# Altium footprint library ST封装.PcbLib: 1336 footprints (part 80 of 109)
Each footprint in its own frame and in the unit in brackets; x right, y up, seen from the top. Pads: shape width x height; smd on the part's side, far side on the other; paste and mask are expansions set on the pad; w line width, h text height; cw(c..) or ccw(c..) is an arc to the next point about the centre after c.
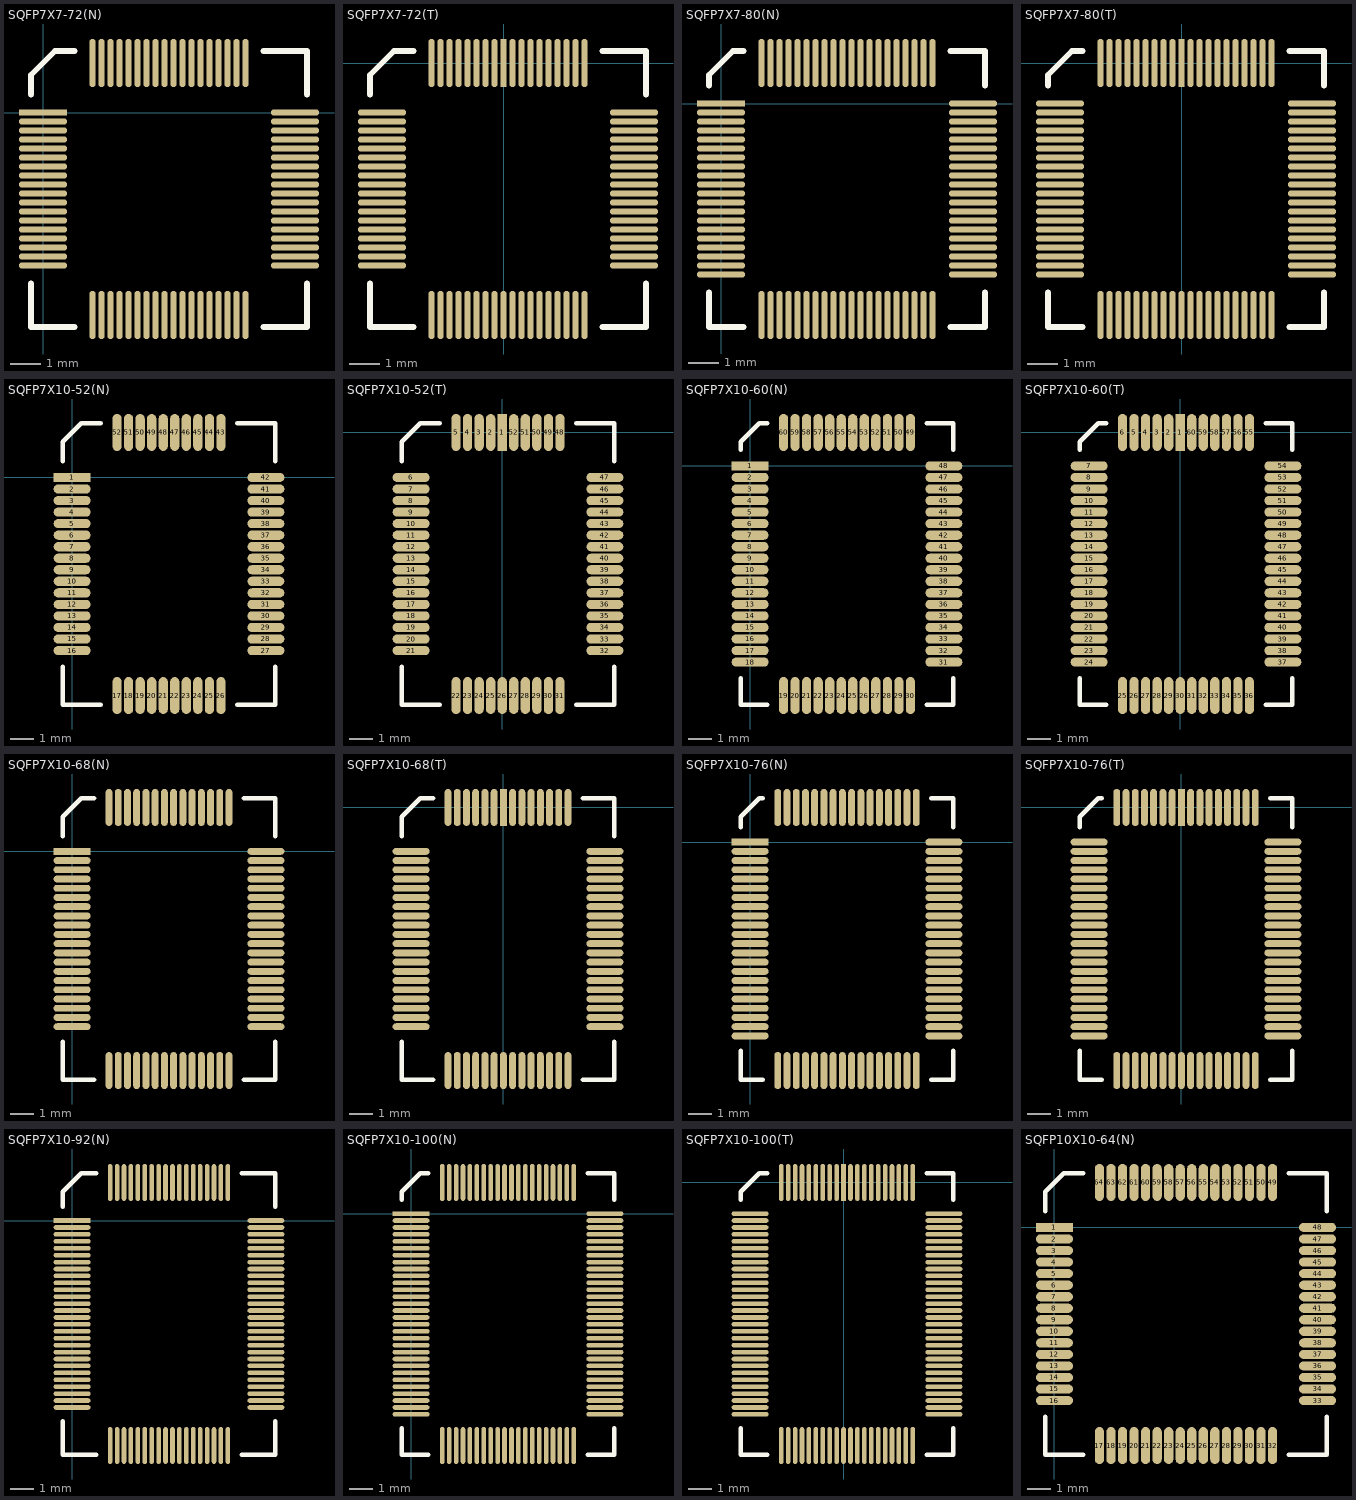
[diagram p79: the footprints below, top view; thin cyan lines are the x and y axes]

## SQFP7X7-72(N) [mm]
pads (72):
  rect 1.6x0.2 smd: 1(0,0)
  oval 1.6x0.2 smd: 2(0,-0.3) 3(0,-0.6) 4(0,-0.9) 5(0,-1.2) 6(0,-1.5) 7(0,-1.8) 8(0,-2.1) 9(0,-2.4) 10(0,-2.7) 11(0,-3) 12(0,-3.3) 13(0,-3.6) 14(0,-3.9) 15(0,-4.2) 16(0,-4.5) 17(0,-4.8) 18(0,-5.1) 37(8.4,-5.1) 38(8.4,-4.8) 39(8.4,-4.5) 40(8.4,-4.2) 41(8.4,-3.9) 42(8.4,-3.6) 43(8.4,-3.3) 44(8.4,-3) 45(8.4,-2.7) 46(8.4,-2.4) 47(8.4,-2.1) 48(8.4,-1.8) 49(8.4,-1.5) 50(8.4,-1.2) 51(8.4,-0.9) 52(8.4,-0.6) 53(8.4,-0.3) 54(8.4,0)
  oval 0.2x1.6 smd: 19(1.65,-6.75) 20(1.95,-6.75) 21(2.25,-6.75) 22(2.55,-6.75) 23(2.85,-6.75) 24(3.15,-6.75) 25(3.45,-6.75) 26(3.75,-6.75) 27(4.05,-6.75) 28(4.35,-6.75) 29(4.65,-6.75) 30(4.95,-6.75) 31(5.25,-6.75) 32(5.55,-6.75) 33(5.85,-6.75) 34(6.15,-6.75) 35(6.45,-6.75) 36(6.75,-6.75) 55(6.75,1.65) 56(6.45,1.65) 57(6.15,1.65) 58(5.85,1.65) 59(5.55,1.65) 60(5.25,1.65) 61(4.95,1.65) 62(4.65,1.65) 63(4.35,1.65) 64(4.05,1.65) 65(3.75,1.65) 66(3.45,1.65) 67(3.15,1.65) 68(2.85,1.65) 69(2.55,1.65) 70(2.25,1.65) 71(1.95,1.65) 72(1.65,1.65)
Top Overlay:
  lines w0.2: -0.4,-5.7 -0.4,-7.15 1.05,-7.15 ; -0.4,0.6 -0.4,1.25 0.4,2.05 1.05,2.05 ; 7.35,-7.15 8.8,-7.15 8.8,-5.7 ; 7.35,2.05 8.8,2.05 8.8,0.6

## SQFP7X7-72(T) [mm]
pads (72):
  rect 0.2x1.6 smd: 1(0,0)
  oval 0.2x1.6 smd: 2(-0.3,0) 3(-0.6,0) 4(-0.9,0) 5(-1.2,0) 6(-1.5,0) 7(-1.8,0) 8(-2.1,0) 9(-2.4,0) 28(-2.4,-8.4) 29(-2.1,-8.4) 30(-1.8,-8.4) 31(-1.5,-8.4) 32(-1.2,-8.4) 33(-0.9,-8.4) 34(-0.6,-8.4) 35(-0.3,-8.4) 36(0,-8.4) 37(0.3,-8.4) 38(0.6,-8.4) 39(0.9,-8.4) 40(1.2,-8.4) 41(1.5,-8.4) 42(1.8,-8.4) 43(2.1,-8.4) 44(2.4,-8.4) 45(2.7,-8.4) 64(2.7,0) 65(2.4,0) 66(2.1,0) 67(1.8,0) 68(1.5,0) 69(1.2,0) 70(0.9,0) 71(0.6,0) 72(0.3,0)
  oval 1.6x0.2 smd: 10(-4.05,-1.65) 11(-4.05,-1.95) 12(-4.05,-2.25) 13(-4.05,-2.55) 14(-4.05,-2.85) 15(-4.05,-3.15) 16(-4.05,-3.45) 17(-4.05,-3.75) 18(-4.05,-4.05) 19(-4.05,-4.35) 20(-4.05,-4.65) 21(-4.05,-4.95) 22(-4.05,-5.25) 23(-4.05,-5.55) 24(-4.05,-5.85) 25(-4.05,-6.15) 26(-4.05,-6.45) 27(-4.05,-6.75) 46(4.35,-6.75) 47(4.35,-6.45) 48(4.35,-6.15) 49(4.35,-5.85) 50(4.35,-5.55) 51(4.35,-5.25) 52(4.35,-4.95) 53(4.35,-4.65) 54(4.35,-4.35) 55(4.35,-4.05) 56(4.35,-3.75) 57(4.35,-3.45) 58(4.35,-3.15) 59(4.35,-2.85) 60(4.35,-2.55) 61(4.35,-2.25) 62(4.35,-1.95) 63(4.35,-1.65)
Top Overlay:
  lines w0.2: -4.45,-7.35 -4.45,-8.8 -3,-8.8 ; -4.45,-1.05 -4.45,-0.4 -3.65,0.4 -3,0.4 ; 3.3,-8.8 4.75,-8.8 4.75,-7.35 ; 3.3,0.4 4.75,0.4 4.75,-1.05

## SQFP7X7-80(N) [mm]
pads (80):
  rect 1.6x0.2 smd: 1(0,0)
  oval 1.6x0.2 smd: 2(0,-0.3) 3(0,-0.6) 4(0,-0.9) 5(0,-1.2) 6(0,-1.5) 7(0,-1.8) 8(0,-2.1) 9(0,-2.4) 10(0,-2.7) 11(0,-3) 12(0,-3.3) 13(0,-3.6) 14(0,-3.9) 15(0,-4.2) 16(0,-4.5) 17(0,-4.8) 18(0,-5.1) 19(0,-5.4) 20(0,-5.7) 41(8.4,-5.7) 42(8.4,-5.4) 43(8.4,-5.1) 44(8.4,-4.8) 45(8.4,-4.5) 46(8.4,-4.2) 47(8.4,-3.9) 48(8.4,-3.6) 49(8.4,-3.3) 50(8.4,-3) 51(8.4,-2.7) 52(8.4,-2.4) 53(8.4,-2.1) 54(8.4,-1.8) 55(8.4,-1.5) 56(8.4,-1.2) 57(8.4,-0.9) 58(8.4,-0.6) 59(8.4,-0.3) 60(8.4,0)
  oval 0.2x1.6 smd: 21(1.35,-7.05) 22(1.65,-7.05) 23(1.95,-7.05) 24(2.25,-7.05) 25(2.55,-7.05) 26(2.85,-7.05) 27(3.15,-7.05) 28(3.45,-7.05) 29(3.75,-7.05) 30(4.05,-7.05) 31(4.35,-7.05) 32(4.65,-7.05) 33(4.95,-7.05) 34(5.25,-7.05) 35(5.55,-7.05) 36(5.85,-7.05) 37(6.15,-7.05) 38(6.45,-7.05) 39(6.75,-7.05) 40(7.05,-7.05) 61(7.05,1.35) 62(6.75,1.35) 63(6.45,1.35) 64(6.15,1.35) 65(5.85,1.35) 66(5.55,1.35) 67(5.25,1.35) 68(4.95,1.35) 69(4.65,1.35) 70(4.35,1.35) 71(4.05,1.35) 72(3.75,1.35) 73(3.45,1.35) 74(3.15,1.35) 75(2.85,1.35) 76(2.55,1.35) 77(2.25,1.35) 78(1.95,1.35) 79(1.65,1.35) 80(1.35,1.35)
Top Overlay:
  lines w0.2: -0.4,-6.3 -0.4,-7.45 0.75,-7.45 ; -0.4,0.6 -0.4,0.95 0.4,1.75 0.75,1.75 ; 7.65,-7.45 8.8,-7.45 8.8,-6.3 ; 7.65,1.75 8.8,1.75 8.8,0.6

## SQFP7X7-80(T) [mm]
pads (80):
  rect 0.2x1.6 smd: 1(0,0)
  oval 0.2x1.6 smd: 2(-0.3,0) 3(-0.6,0) 4(-0.9,0) 5(-1.2,0) 6(-1.5,0) 7(-1.8,0) 8(-2.1,0) 9(-2.4,0) 10(-2.7,0) 31(-2.7,-8.4) 32(-2.4,-8.4) 33(-2.1,-8.4) 34(-1.8,-8.4) 35(-1.5,-8.4) 36(-1.2,-8.4) 37(-0.9,-8.4) 38(-0.6,-8.4) 39(-0.3,-8.4) 40(0,-8.4) 41(0.3,-8.4) 42(0.6,-8.4) 43(0.9,-8.4) 44(1.2,-8.4) 45(1.5,-8.4) 46(1.8,-8.4) 47(2.1,-8.4) 48(2.4,-8.4) 49(2.7,-8.4) 50(3,-8.4) 71(3,0) 72(2.7,0) 73(2.4,0) 74(2.1,0) 75(1.8,0) 76(1.5,0) 77(1.2,0) 78(0.9,0) 79(0.6,0) 80(0.3,0)
  oval 1.6x0.2 smd: 11(-4.05,-1.35) 12(-4.05,-1.65) 13(-4.05,-1.95) 14(-4.05,-2.25) 15(-4.05,-2.55) 16(-4.05,-2.85) 17(-4.05,-3.15) 18(-4.05,-3.45) 19(-4.05,-3.75) 20(-4.05,-4.05) 21(-4.05,-4.35) 22(-4.05,-4.65) 23(-4.05,-4.95) 24(-4.05,-5.25) 25(-4.05,-5.55) 26(-4.05,-5.85) 27(-4.05,-6.15) 28(-4.05,-6.45) 29(-4.05,-6.75) 30(-4.05,-7.05) 51(4.35,-7.05) 52(4.35,-6.75) 53(4.35,-6.45) 54(4.35,-6.15) 55(4.35,-5.85) 56(4.35,-5.55) 57(4.35,-5.25) 58(4.35,-4.95) 59(4.35,-4.65) 60(4.35,-4.35) 61(4.35,-4.05) 62(4.35,-3.75) 63(4.35,-3.45) 64(4.35,-3.15) 65(4.35,-2.85) 66(4.35,-2.55) 67(4.35,-2.25) 68(4.35,-1.95) 69(4.35,-1.65) 70(4.35,-1.35)
Top Overlay:
  lines w0.2: -4.45,-7.65 -4.45,-8.8 -3.3,-8.8 ; -4.45,-0.75 -4.45,-0.4 -3.65,0.4 -3.3,0.4 ; 3.6,-8.8 4.75,-8.8 4.75,-7.65 ; 3.6,0.4 4.75,0.4 4.75,-0.75

## SQFP7X10-52(N) [mm]
pads (52):
  rect 1.6x0.4 smd: 1(0,0)
  oval 1.6x0.4 smd: 2(0,-0.5) 3(0,-1) 4(0,-1.5) 5(0,-2) 6(0,-2.5) 7(0,-3) 8(0,-3.5) 9(0,-4) 10(0,-4.5) 11(0,-5) 12(0,-5.5) 13(0,-6) 14(0,-6.5) 15(0,-7) 16(0,-7.5) 27(8.4,-7.5) 28(8.4,-7) 29(8.4,-6.5) 30(8.4,-6) 31(8.4,-5.5) 32(8.4,-5) 33(8.4,-4.5) 34(8.4,-4) 35(8.4,-3.5) 36(8.4,-3) 37(8.4,-2.5) 38(8.4,-2) 39(8.4,-1.5) 40(8.4,-1) 41(8.4,-0.5) 42(8.4,0)
  oval 0.4x1.6 smd: 17(1.95,-9.45) 18(2.45,-9.45) 19(2.95,-9.45) 20(3.45,-9.45) 21(3.95,-9.45) 22(4.45,-9.45) 23(4.95,-9.45) 24(5.45,-9.45) 25(5.95,-9.45) 26(6.45,-9.45) 43(6.45,1.95) 44(5.95,1.95) 45(5.45,1.95) 46(4.95,1.95) 47(4.45,1.95) 48(3.95,1.95) 49(3.45,1.95) 50(2.95,1.95) 51(2.45,1.95) 52(1.95,1.95)
Top Overlay:
  lines w0.2: -0.4,-8.2 -0.4,-9.85 1.25,-9.85 ; -0.4,0.7 -0.4,1.55 0.4,2.35 1.25,2.35 ; 7.15,-9.85 8.8,-9.85 8.8,-8.2 ; 7.15,2.35 8.8,2.35 8.8,0.7

## SQFP7X10-52(T) [mm]
pads (52):
  rect 0.4x1.6 smd: 1(0,0)
  oval 0.4x1.6 smd: 2(-0.5,0) 3(-1,0) 4(-1.5,0) 5(-2,0) 22(-2,-11.4) 23(-1.5,-11.4) 24(-1,-11.4) 25(-0.5,-11.4) 26(0,-11.4) 27(0.5,-11.4) 28(1,-11.4) 29(1.5,-11.4) 30(2,-11.4) 31(2.5,-11.4) 48(2.5,0) 49(2,0) 50(1.5,0) 51(1,0) 52(0.5,0)
  oval 1.6x0.4 smd: 6(-3.95,-1.95) 7(-3.95,-2.45) 8(-3.95,-2.95) 9(-3.95,-3.45) 10(-3.95,-3.95) 11(-3.95,-4.45) 12(-3.95,-4.95) 13(-3.95,-5.45) 14(-3.95,-5.95) 15(-3.95,-6.45) 16(-3.95,-6.95) 17(-3.95,-7.45) 18(-3.95,-7.95) 19(-3.95,-8.45) 20(-3.95,-8.95) 21(-3.95,-9.45) 32(4.45,-9.45) 33(4.45,-8.95) 34(4.45,-8.45) 35(4.45,-7.95) 36(4.45,-7.45) 37(4.45,-6.95) 38(4.45,-6.45) 39(4.45,-5.95) 40(4.45,-5.45) 41(4.45,-4.95) 42(4.45,-4.45) 43(4.45,-3.95) 44(4.45,-3.45) 45(4.45,-2.95) 46(4.45,-2.45) 47(4.45,-1.95)
Top Overlay:
  lines w0.2: -4.35,-10.15 -4.35,-11.8 -2.7,-11.8 ; -4.35,-1.25 -4.35,-0.4 -3.55,0.4 -2.7,0.4 ; 3.2,-11.8 4.85,-11.8 4.85,-10.15 ; 3.2,0.4 4.85,0.4 4.85,-1.25

## SQFP7X10-60(N) [mm]
pads (60):
  rect 1.6x0.4 smd: 1(0,0)
  oval 1.6x0.4 smd: 2(0,-0.5) 3(0,-1) 4(0,-1.5) 5(0,-2) 6(0,-2.5) 7(0,-3) 8(0,-3.5) 9(0,-4) 10(0,-4.5) 11(0,-5) 12(0,-5.5) 13(0,-6) 14(0,-6.5) 15(0,-7) 16(0,-7.5) 17(0,-8) 18(0,-8.5) 31(8.4,-8.5) 32(8.4,-8) 33(8.4,-7.5) 34(8.4,-7) 35(8.4,-6.5) 36(8.4,-6) 37(8.4,-5.5) 38(8.4,-5) 39(8.4,-4.5) 40(8.4,-4) 41(8.4,-3.5) 42(8.4,-3) 43(8.4,-2.5) 44(8.4,-2) 45(8.4,-1.5) 46(8.4,-1) 47(8.4,-0.5) 48(8.4,0)
  oval 0.4x1.6 smd: 19(1.45,-9.95) 20(1.95,-9.95) 21(2.45,-9.95) 22(2.95,-9.95) 23(3.45,-9.95) 24(3.95,-9.95) 25(4.45,-9.95) 26(4.95,-9.95) 27(5.45,-9.95) 28(5.95,-9.95) 29(6.45,-9.95) 30(6.95,-9.95) 49(6.95,1.45) 50(6.45,1.45) 51(5.95,1.45) 52(5.45,1.45) 53(4.95,1.45) 54(4.45,1.45) 55(3.95,1.45) 56(3.45,1.45) 57(2.95,1.45) 58(2.45,1.45) 59(1.95,1.45) 60(1.45,1.45)
Top Overlay:
  lines w0.2: -0.4,-9.2 -0.4,-10.35 0.75,-10.35 ; -0.4,0.7 -0.4,1.05 0.4,1.85 0.75,1.85 ; 7.65,-10.35 8.8,-10.35 8.8,-9.2 ; 7.65,1.85 8.8,1.85 8.8,0.7

## SQFP7X10-60(T) [mm]
pads (60):
  rect 0.4x1.6 smd: 1(0,0)
  oval 0.4x1.6 smd: 2(-0.5,0) 3(-1,0) 4(-1.5,0) 5(-2,0) 6(-2.5,0) 25(-2.5,-11.4) 26(-2,-11.4) 27(-1.5,-11.4) 28(-1,-11.4) 29(-0.5,-11.4) 30(0,-11.4) 31(0.5,-11.4) 32(1,-11.4) 33(1.5,-11.4) 34(2,-11.4) 35(2.5,-11.4) 36(3,-11.4) 55(3,0) 56(2.5,0) 57(2,0) 58(1.5,0) 59(1,0) 60(0.5,0)
  oval 1.6x0.4 smd: 7(-3.95,-1.45) 8(-3.95,-1.95) 9(-3.95,-2.45) 10(-3.95,-2.95) 11(-3.95,-3.45) 12(-3.95,-3.95) 13(-3.95,-4.45) 14(-3.95,-4.95) 15(-3.95,-5.45) 16(-3.95,-5.95) 17(-3.95,-6.45) 18(-3.95,-6.95) 19(-3.95,-7.45) 20(-3.95,-7.95) 21(-3.95,-8.45) 22(-3.95,-8.95) 23(-3.95,-9.45) 24(-3.95,-9.95) 37(4.45,-9.95) 38(4.45,-9.45) 39(4.45,-8.95) 40(4.45,-8.45) 41(4.45,-7.95) 42(4.45,-7.45) 43(4.45,-6.95) 44(4.45,-6.45) 45(4.45,-5.95) 46(4.45,-5.45) 47(4.45,-4.95) 48(4.45,-4.45) 49(4.45,-3.95) 50(4.45,-3.45) 51(4.45,-2.95) 52(4.45,-2.45) 53(4.45,-1.95) 54(4.45,-1.45)
Top Overlay:
  lines w0.2: -4.35,-10.65 -4.35,-11.8 -3.2,-11.8 ; -4.35,-0.75 -4.35,-0.4 -3.55,0.4 -3.2,0.4 ; 3.7,-11.8 4.85,-11.8 4.85,-10.65 ; 3.7,0.4 4.85,0.4 4.85,-0.75

## SQFP7X10-68(N) [mm]
pads (68):
  rect 1.6x0.3 smd: 1(0,0)
  oval 1.6x0.3 smd: 2(0,-0.4) 3(0,-0.8) 4(0,-1.2) 5(0,-1.6) 6(0,-2) 7(0,-2.4) 8(0,-2.8) 9(0,-3.2) 10(0,-3.6) 11(0,-4) 12(0,-4.4) 13(0,-4.8) 14(0,-5.2) 15(0,-5.6) 16(0,-6) 17(0,-6.4) 18(0,-6.8) 19(0,-7.2) 20(0,-7.6) 35(8.4,-7.6) 36(8.4,-7.2) 37(8.4,-6.8) 38(8.4,-6.4) 39(8.4,-6) 40(8.4,-5.6) 41(8.4,-5.2) 42(8.4,-4.8) 43(8.4,-4.4) 44(8.4,-4) 45(8.4,-3.6) 46(8.4,-3.2) 47(8.4,-2.8) 48(8.4,-2.4) 49(8.4,-2) 50(8.4,-1.6) 51(8.4,-1.2) 52(8.4,-0.8) 53(8.4,-0.4) 54(8.4,0)
  oval 0.3x1.6 smd: 21(1.6,-9.5) 22(2,-9.5) 23(2.4,-9.5) 24(2.8,-9.5) 25(3.2,-9.5) 26(3.6,-9.5) 27(4,-9.5) 28(4.4,-9.5) 29(4.8,-9.5) 30(5.2,-9.5) 31(5.6,-9.5) 32(6,-9.5) 33(6.4,-9.5) 34(6.8,-9.5) 55(6.8,1.9) 56(6.4,1.9) 57(6,1.9) 58(5.6,1.9) 59(5.2,1.9) 60(4.8,1.9) 61(4.4,1.9) 62(4,1.9) 63(3.6,1.9) 64(3.2,1.9) 65(2.8,1.9) 66(2.4,1.9) 67(2,1.9) 68(1.6,1.9)
Top Overlay:
  lines w0.2: -0.4,-8.25 -0.4,-9.9 0.95,-9.9 ; -0.4,0.65 -0.4,1.5 0.4,2.3 0.95,2.3 ; 7.45,-9.9 8.8,-9.9 8.8,-8.25 ; 7.45,2.3 8.8,2.3 8.8,0.65

## SQFP7X10-68(T) [mm]
pads (68):
  rect 0.3x1.6 smd: 1(0,0)
  oval 0.3x1.6 smd: 2(-0.4,0) 3(-0.8,0) 4(-1.2,0) 5(-1.6,0) 6(-2,0) 7(-2.4,0) 28(-2.4,-11.4) 29(-2,-11.4) 30(-1.6,-11.4) 31(-1.2,-11.4) 32(-0.8,-11.4) 33(-0.4,-11.4) 34(0,-11.4) 35(0.4,-11.4) 36(0.8,-11.4) 37(1.2,-11.4) 38(1.6,-11.4) 39(2,-11.4) 40(2.4,-11.4) 41(2.8,-11.4) 62(2.8,0) 63(2.4,0) 64(2,0) 65(1.6,0) 66(1.2,0) 67(0.8,0) 68(0.4,0)
  oval 1.6x0.3 smd: 8(-4,-1.9) 9(-4,-2.3) 10(-4,-2.7) 11(-4,-3.1) 12(-4,-3.5) 13(-4,-3.9) 14(-4,-4.3) 15(-4,-4.7) 16(-4,-5.1) 17(-4,-5.5) 18(-4,-5.9) 19(-4,-6.3) 20(-4,-6.7) 21(-4,-7.1) 22(-4,-7.5) 23(-4,-7.9) 24(-4,-8.3) 25(-4,-8.7) 26(-4,-9.1) 27(-4,-9.5) 42(4.4,-9.5) 43(4.4,-9.1) 44(4.4,-8.7) 45(4.4,-8.3) 46(4.4,-7.9) 47(4.4,-7.5) 48(4.4,-7.1) 49(4.4,-6.7) 50(4.4,-6.3) 51(4.4,-5.9) 52(4.4,-5.5) 53(4.4,-5.1) 54(4.4,-4.7) 55(4.4,-4.3) 56(4.4,-3.9) 57(4.4,-3.5) 58(4.4,-3.1) 59(4.4,-2.7) 60(4.4,-2.3) 61(4.4,-1.9)
Top Overlay:
  lines w0.2: -4.4,-10.15 -4.4,-11.8 -3.05,-11.8 ; -4.4,-1.25 -4.4,-0.4 -3.6,0.4 -3.05,0.4 ; 3.45,-11.8 4.8,-11.8 4.8,-10.15 ; 3.45,0.4 4.8,0.4 4.8,-1.25

## SQFP7X10-76(N) [mm]
pads (76):
  rect 1.6x0.3 smd: 1(0,0)
  oval 1.6x0.3 smd: 2(0,-0.4) 3(0,-0.8) 4(0,-1.2) 5(0,-1.6) 6(0,-2) 7(0,-2.4) 8(0,-2.8) 9(0,-3.2) 10(0,-3.6) 11(0,-4) 12(0,-4.4) 13(0,-4.8) 14(0,-5.2) 15(0,-5.6) 16(0,-6) 17(0,-6.4) 18(0,-6.8) 19(0,-7.2) 20(0,-7.6) 21(0,-8) 22(0,-8.4) 39(8.4,-8.4) 40(8.4,-8) 41(8.4,-7.6) 42(8.4,-7.2) 43(8.4,-6.8) 44(8.4,-6.4) 45(8.4,-6) 46(8.4,-5.6) 47(8.4,-5.2) 48(8.4,-4.8) 49(8.4,-4.4) 50(8.4,-4) 51(8.4,-3.6) 52(8.4,-3.2) 53(8.4,-2.8) 54(8.4,-2.4) 55(8.4,-2) 56(8.4,-1.6) 57(8.4,-1.2) 58(8.4,-0.8) 59(8.4,-0.4) 60(8.4,0)
  oval 0.3x1.6 smd: 23(1.2,-9.9) 24(1.6,-9.9) 25(2,-9.9) 26(2.4,-9.9) 27(2.8,-9.9) 28(3.2,-9.9) 29(3.6,-9.9) 30(4,-9.9) 31(4.4,-9.9) 32(4.8,-9.9) 33(5.2,-9.9) 34(5.6,-9.9) 35(6,-9.9) 36(6.4,-9.9) 37(6.8,-9.9) 38(7.2,-9.9) 61(7.2,1.5) 62(6.8,1.5) 63(6.4,1.5) 64(6,1.5) 65(5.6,1.5) 66(5.2,1.5) 67(4.8,1.5) 68(4.4,1.5) 69(4,1.5) 70(3.6,1.5) 71(3.2,1.5) 72(2.8,1.5) 73(2.4,1.5) 74(2,1.5) 75(1.6,1.5) 76(1.2,1.5)
Top Overlay:
  lines w0.2: -0.4,-9.05 -0.4,-10.3 0.55,-10.3 ; -0.4,0.65 -0.4,1.1 0.4,1.9 0.55,1.9 ; 7.85,-10.3 8.8,-10.3 8.8,-9.05 ; 7.85,1.9 8.8,1.9 8.8,0.65

## SQFP7X10-76(T) [mm]
pads (76):
  rect 0.3x1.6 smd: 1(0,0)
  oval 0.3x1.6 smd: 2(-0.4,0) 3(-0.8,0) 4(-1.2,0) 5(-1.6,0) 6(-2,0) 7(-2.4,0) 8(-2.8,0) 31(-2.8,-11.4) 32(-2.4,-11.4) 33(-2,-11.4) 34(-1.6,-11.4) 35(-1.2,-11.4) 36(-0.8,-11.4) 37(-0.4,-11.4) 38(0,-11.4) 39(0.4,-11.4) 40(0.8,-11.4) 41(1.2,-11.4) 42(1.6,-11.4) 43(2,-11.4) 44(2.4,-11.4) 45(2.8,-11.4) 46(3.2,-11.4) 69(3.2,0) 70(2.8,0) 71(2.4,0) 72(2,0) 73(1.6,0) 74(1.2,0) 75(0.8,0) 76(0.4,0)
  oval 1.6x0.3 smd: 9(-4,-1.5) 10(-4,-1.9) 11(-4,-2.3) 12(-4,-2.7) 13(-4,-3.1) 14(-4,-3.5) 15(-4,-3.9) 16(-4,-4.3) 17(-4,-4.7) 18(-4,-5.1) 19(-4,-5.5) 20(-4,-5.9) 21(-4,-6.3) 22(-4,-6.7) 23(-4,-7.1) 24(-4,-7.5) 25(-4,-7.9) 26(-4,-8.3) 27(-4,-8.7) 28(-4,-9.1) 29(-4,-9.5) 30(-4,-9.9) 47(4.4,-9.9) 48(4.4,-9.5) 49(4.4,-9.1) 50(4.4,-8.7) 51(4.4,-8.3) 52(4.4,-7.9) 53(4.4,-7.5) 54(4.4,-7.1) 55(4.4,-6.7) 56(4.4,-6.3) 57(4.4,-5.9) 58(4.4,-5.5) 59(4.4,-5.1) 60(4.4,-4.7) 61(4.4,-4.3) 62(4.4,-3.9) 63(4.4,-3.5) 64(4.4,-3.1) 65(4.4,-2.7) 66(4.4,-2.3) 67(4.4,-1.9) 68(4.4,-1.5)
Top Overlay:
  lines w0.2: -4.4,-10.55 -4.4,-11.8 -3.45,-11.8 ; -4.4,-0.85 -4.4,-0.4 -3.6,0.4 -3.45,0.4 ; 3.85,-11.8 4.8,-11.8 4.8,-10.55 ; 3.85,0.4 4.8,0.4 4.8,-0.85

## SQFP7X10-92(N) [mm]
pads (92):
  rect 1.6x0.2 smd: 1(0,0)
  oval 1.6x0.2 smd: 2(0,-0.3) 3(0,-0.6) 4(0,-0.9) 5(0,-1.2) 6(0,-1.5) 7(0,-1.8) 8(0,-2.1) 9(0,-2.4) 10(0,-2.7) 11(0,-3) 12(0,-3.3) 13(0,-3.6) 14(0,-3.9) 15(0,-4.2) 16(0,-4.5) 17(0,-4.8) 18(0,-5.1) 19(0,-5.4) 20(0,-5.7) 21(0,-6) 22(0,-6.3) 23(0,-6.6) 24(0,-6.9) 25(0,-7.2) 26(0,-7.5) 27(0,-7.8) 28(0,-8.1) 47(8.4,-8.1) 48(8.4,-7.8) 49(8.4,-7.5) 50(8.4,-7.2) 51(8.4,-6.9) 52(8.4,-6.6) 53(8.4,-6.3) 54(8.4,-6) 55(8.4,-5.7) 56(8.4,-5.4) 57(8.4,-5.1) 58(8.4,-4.8) 59(8.4,-4.5) 60(8.4,-4.2) 61(8.4,-3.9) 62(8.4,-3.6) 63(8.4,-3.3) 64(8.4,-3) 65(8.4,-2.7) 66(8.4,-2.4) 67(8.4,-2.1) 68(8.4,-1.8) 69(8.4,-1.5) 70(8.4,-1.2) 71(8.4,-0.9) 72(8.4,-0.6) 73(8.4,-0.3) 74(8.4,0)
  oval 0.2x1.6 smd: 29(1.65,-9.75) 30(1.95,-9.75) 31(2.25,-9.75) 32(2.55,-9.75) 33(2.85,-9.75) 34(3.15,-9.75) 35(3.45,-9.75) 36(3.75,-9.75) 37(4.05,-9.75) 38(4.35,-9.75) 39(4.65,-9.75) 40(4.95,-9.75) 41(5.25,-9.75) 42(5.55,-9.75) 43(5.85,-9.75) 44(6.15,-9.75) 45(6.45,-9.75) 46(6.75,-9.75) 75(6.75,1.65) 76(6.45,1.65) 77(6.15,1.65) 78(5.85,1.65) 79(5.55,1.65) 80(5.25,1.65) 81(4.95,1.65) 82(4.65,1.65) 83(4.35,1.65) 84(4.05,1.65) 85(3.75,1.65) 86(3.45,1.65) 87(3.15,1.65) 88(2.85,1.65) 89(2.55,1.65) 90(2.25,1.65) 91(1.95,1.65) 92(1.65,1.65)
Top Overlay:
  lines w0.2: -0.4,-8.7 -0.4,-10.15 1.05,-10.15 ; -0.4,0.6 -0.4,1.25 0.4,2.05 1.05,2.05 ; 7.35,-10.15 8.8,-10.15 8.8,-8.7 ; 7.35,2.05 8.8,2.05 8.8,0.6

## SQFP7X10-100(N) [mm]
pads (100):
  rect 1.6x0.2 smd: 1(0,0)
  oval 1.6x0.2 smd: 2(0,-0.3) 3(0,-0.6) 4(0,-0.9) 5(0,-1.2) 6(0,-1.5) 7(0,-1.8) 8(0,-2.1) 9(0,-2.4) 10(0,-2.7) 11(0,-3) 12(0,-3.3) 13(0,-3.6) 14(0,-3.9) 15(0,-4.2) 16(0,-4.5) 17(0,-4.8) 18(0,-5.1) 19(0,-5.4) 20(0,-5.7) 21(0,-6) 22(0,-6.3) 23(0,-6.6) 24(0,-6.9) 25(0,-7.2) 26(0,-7.5) 27(0,-7.8) 28(0,-8.1) 29(0,-8.4) 30(0,-8.7) 51(8.4,-8.7) 52(8.4,-8.4) 53(8.4,-8.1) 54(8.4,-7.8) 55(8.4,-7.5) 56(8.4,-7.2) 57(8.4,-6.9) 58(8.4,-6.6) 59(8.4,-6.3) 60(8.4,-6) 61(8.4,-5.7) 62(8.4,-5.4) 63(8.4,-5.1) 64(8.4,-4.8) 65(8.4,-4.5) 66(8.4,-4.2) 67(8.4,-3.9) 68(8.4,-3.6) 69(8.4,-3.3) 70(8.4,-3) 71(8.4,-2.7) 72(8.4,-2.4) 73(8.4,-2.1) 74(8.4,-1.8) 75(8.4,-1.5) 76(8.4,-1.2) 77(8.4,-0.9) 78(8.4,-0.6) 79(8.4,-0.3) 80(8.4,0)
  oval 0.2x1.6 smd: 31(1.35,-10.05) 32(1.65,-10.05) 33(1.95,-10.05) 34(2.25,-10.05) 35(2.55,-10.05) 36(2.85,-10.05) 37(3.15,-10.05) 38(3.45,-10.05) 39(3.75,-10.05) 40(4.05,-10.05) 41(4.35,-10.05) 42(4.65,-10.05) 43(4.95,-10.05) 44(5.25,-10.05) 45(5.55,-10.05) 46(5.85,-10.05) 47(6.15,-10.05) 48(6.45,-10.05) 49(6.75,-10.05) 50(7.05,-10.05) 81(7.05,1.35) 82(6.75,1.35) 83(6.45,1.35) 84(6.15,1.35) 85(5.85,1.35) 86(5.55,1.35) 87(5.25,1.35) 88(4.95,1.35) 89(4.65,1.35) 90(4.35,1.35) 91(4.05,1.35) 92(3.75,1.35) 93(3.45,1.35) 94(3.15,1.35) 95(2.85,1.35) 96(2.55,1.35) 97(2.25,1.35) 98(1.95,1.35) 99(1.65,1.35) 100(1.35,1.35)
Top Overlay:
  lines w0.2: -0.4,-9.3 -0.4,-10.45 0.75,-10.45 ; -0.4,0.6 -0.4,0.95 0.4,1.75 0.75,1.75 ; 7.65,-10.45 8.8,-10.45 8.8,-9.3 ; 7.65,1.75 8.8,1.75 8.8,0.6

## SQFP7X10-100(T) [mm]
pads (100):
  rect 0.2x1.6 smd: 1(0,0)
  oval 0.2x1.6 smd: 2(-0.3,0) 3(-0.6,0) 4(-0.9,0) 5(-1.2,0) 6(-1.5,0) 7(-1.8,0) 8(-2.1,0) 9(-2.4,0) 10(-2.7,0) 41(-2.7,-11.4) 42(-2.4,-11.4) 43(-2.1,-11.4) 44(-1.8,-11.4) 45(-1.5,-11.4) 46(-1.2,-11.4) 47(-0.9,-11.4) 48(-0.6,-11.4) 49(-0.3,-11.4) 50(0,-11.4) 51(0.3,-11.4) 52(0.6,-11.4) 53(0.9,-11.4) 54(1.2,-11.4) 55(1.5,-11.4) 56(1.8,-11.4) 57(2.1,-11.4) 58(2.4,-11.4) 59(2.7,-11.4) 60(3,-11.4) 91(3,0) 92(2.7,0) 93(2.4,0) 94(2.1,0) 95(1.8,0) 96(1.5,0) 97(1.2,0) 98(0.9,0) 99(0.6,0) 100(0.3,0)
  oval 1.6x0.2 smd: 11(-4.05,-1.35) 12(-4.05,-1.65) 13(-4.05,-1.95) 14(-4.05,-2.25) 15(-4.05,-2.55) 16(-4.05,-2.85) 17(-4.05,-3.15) 18(-4.05,-3.45) 19(-4.05,-3.75) 20(-4.05,-4.05) 21(-4.05,-4.35) 22(-4.05,-4.65) 23(-4.05,-4.95) 24(-4.05,-5.25) 25(-4.05,-5.55) 26(-4.05,-5.85) 27(-4.05,-6.15) 28(-4.05,-6.45) 29(-4.05,-6.75) 30(-4.05,-7.05) 31(-4.05,-7.35) 32(-4.05,-7.65) 33(-4.05,-7.95) 34(-4.05,-8.25) 35(-4.05,-8.55) 36(-4.05,-8.85) 37(-4.05,-9.15) 38(-4.05,-9.45) 39(-4.05,-9.75) 40(-4.05,-10.05) 61(4.35,-10.05) 62(4.35,-9.75) 63(4.35,-9.45) 64(4.35,-9.15) 65(4.35,-8.85) 66(4.35,-8.55) 67(4.35,-8.25) 68(4.35,-7.95) 69(4.35,-7.65) 70(4.35,-7.35) 71(4.35,-7.05) 72(4.35,-6.75) 73(4.35,-6.45) 74(4.35,-6.15) 75(4.35,-5.85) 76(4.35,-5.55) 77(4.35,-5.25) 78(4.35,-4.95) 79(4.35,-4.65) 80(4.35,-4.35) 81(4.35,-4.05) 82(4.35,-3.75) 83(4.35,-3.45) 84(4.35,-3.15) 85(4.35,-2.85) 86(4.35,-2.55) 87(4.35,-2.25) 88(4.35,-1.95) 89(4.35,-1.65) 90(4.35,-1.35)
Top Overlay:
  lines w0.2: -4.45,-10.65 -4.45,-11.8 -3.3,-11.8 ; -4.45,-0.75 -4.45,-0.4 -3.65,0.4 -3.3,0.4 ; 3.6,-11.8 4.75,-11.8 4.75,-10.65 ; 3.6,0.4 4.75,0.4 4.75,-0.75

## SQFP10X10-64(N) [mm]
pads (64):
  rect 1.6x0.4 smd: 1(0,0)
  oval 1.6x0.4 smd: 2(0,-0.5) 3(0,-1) 4(0,-1.5) 5(0,-2) 6(0,-2.5) 7(0,-3) 8(0,-3.5) 9(0,-4) 10(0,-4.5) 11(0,-5) 12(0,-5.5) 13(0,-6) 14(0,-6.5) 15(0,-7) 16(0,-7.5) 33(11.4,-7.5) 34(11.4,-7) 35(11.4,-6.5) 36(11.4,-6) 37(11.4,-5.5) 38(11.4,-5) 39(11.4,-4.5) 40(11.4,-4) 41(11.4,-3.5) 42(11.4,-3) 43(11.4,-2.5) 44(11.4,-2) 45(11.4,-1.5) 46(11.4,-1) 47(11.4,-0.5) 48(11.4,0)
  oval 0.4x1.6 smd: 17(1.95,-9.45) 18(2.45,-9.45) 19(2.95,-9.45) 20(3.45,-9.45) 21(3.95,-9.45) 22(4.45,-9.45) 23(4.95,-9.45) 24(5.45,-9.45) 25(5.95,-9.45) 26(6.45,-9.45) 27(6.95,-9.45) 28(7.45,-9.45) 29(7.95,-9.45) 30(8.45,-9.45) 31(8.95,-9.45) 32(9.45,-9.45) 49(9.45,1.95) 50(8.95,1.95) 51(8.45,1.95) 52(7.95,1.95) 53(7.45,1.95) 54(6.95,1.95) 55(6.45,1.95) 56(5.95,1.95) 57(5.45,1.95) 58(4.95,1.95) 59(4.45,1.95) 60(3.95,1.95) 61(3.45,1.95) 62(2.95,1.95) 63(2.45,1.95) 64(1.95,1.95)
Top Overlay:
  lines w0.2: -0.4,-8.2 -0.4,-9.85 1.25,-9.85 ; -0.4,0.7 -0.4,1.55 0.4,2.35 1.25,2.35 ; 10.15,-9.85 11.8,-9.85 11.8,-8.2 ; 10.15,2.35 11.8,2.35 11.8,0.7